# Altium footprint library xialeste-20221209.PcbLib: 113 footprints (part 4 of 8)
Each footprint in its own frame and in the unit in brackets; x right, y up, seen from the top. Pads: shape width x height; smd on the part's side, far side on the other; paste and mask are expansions set on the pad; w line width, h text height; cw(c..) or ccw(c..) is an arc to the next point about the centre after c.
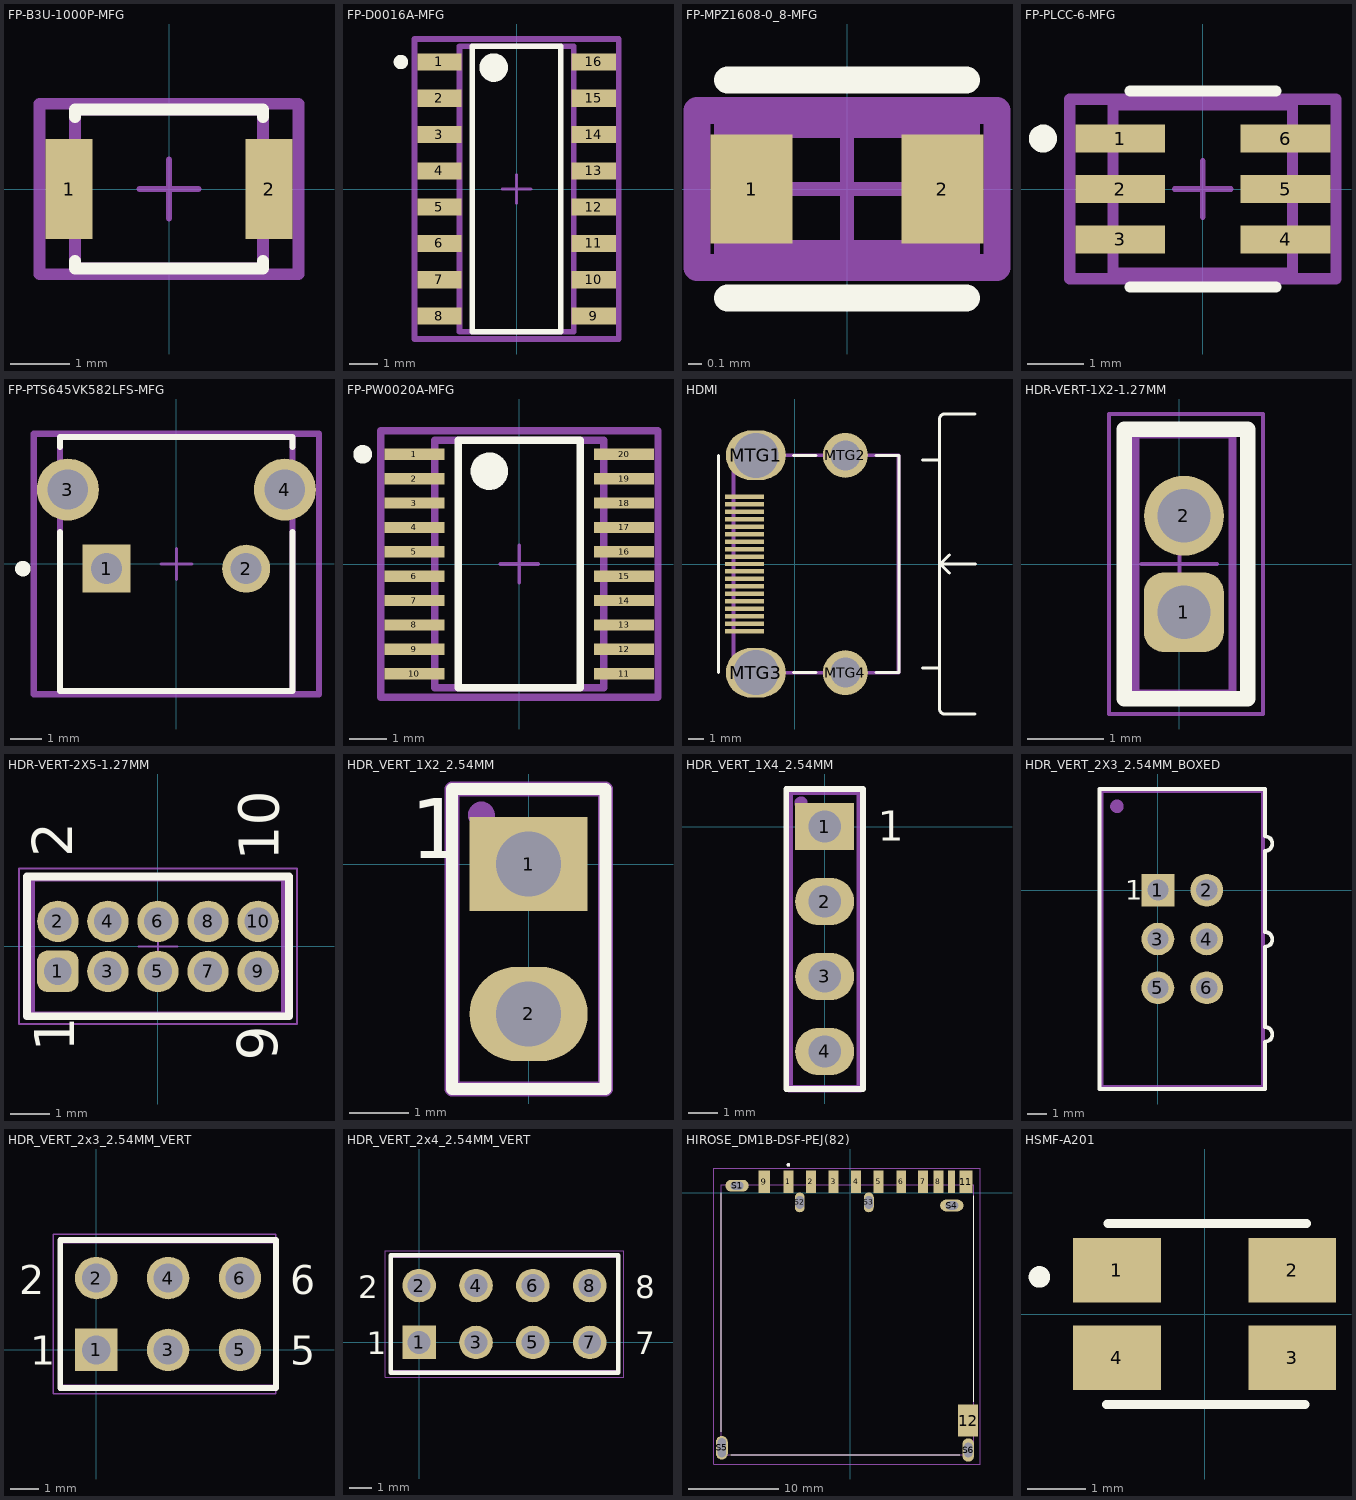
[diagram p3: the footprints below, top view; thin cyan lines are the x and y axes]

## FP-B3U-1000P-MFG [mm]
pads (2):
  rect 0.8x1.7 smd paste+0 mask+0: 1(-1.7,0) 2(1.7,0)
Top Overlay:
  lines w0.2: -1.6,-1.225 -1.6,-1.35 1.6,-1.35 1.6,-1.225 ; -1.6,1.225 -1.6,1.35 1.6,1.35 1.6,1.225
Top 3D Body:
  lines w0.2: -1.6,-1.35 1.6,-1.35 1.6,1.35 -1.6,1.35 -1.6,-1.35
Top Courtyard:
  lines w0.2: -2.2,-1.45 2.2,-1.45 2.2,1.45 -2.2,1.45 -2.2,-1.45
Top Assembly:
  lines w0.2: -2.2,-1.45 2.2,-1.45 2.2,1.45 -2.2,1.45 -2.2,-1.45
  text ".Designator" at 0,0.187 h1
Top Component Center:
  lines w0.1: -0.5,0 0.5,0 ; 0,-0.5 0,0.5
3D body "B3U-1000P--3DModel-STEP-56544.STEP": height 1.75, standoff 0, extent -2,-1.25 2,1.25

## FP-D0016A-MFG [mm]
pads (16):
  rect 1.55x0.6 smd paste-1000 mask+0: 1(-2.7,4.445) 2(-2.7,3.175) 3(-2.7,1.905) 4(-2.7,0.635) 5(-2.7,-0.635) 6(-2.7,-1.905) 7(-2.7,-3.175) 8(-2.7,-4.445) 9(2.7,-4.445) 10(2.7,-3.175) 11(2.7,-1.905) 12(2.7,-0.635) 13(2.7,0.635) 14(2.7,1.905) 15(2.7,3.175) 16(2.7,4.445)
Top Overlay:
  circle w0.25: c-4.05,4.445 r0.125
  circle w0.5: c-0.8,4.25 r0.25
  lines w0.2: -1.55,-5 1.55,-5 ; -1.55,-5 1.55,-5 ; -1.55,-5 -1.55,5 1.55,5 1.55,-5
Top Paste:
  rectangle: 1.95,-4.72 3.45,-4.17
  rectangle: 1.95,-3.45 3.45,-2.9
  rectangle: 1.95,-2.18 3.45,-1.63
  rectangle: 1.95,-0.91 3.45,-0.36
  rectangle: 1.95,0.36 3.45,0.91
  rectangle: 1.95,1.63 3.45,2.18
  rectangle: 1.95,2.9 3.45,3.45
  rectangle: 1.95,4.17 3.45,4.72
  rectangle: -3.45,-4.72 -1.95,-4.17
  rectangle: -3.45,-3.45 -1.95,-2.9
  rectangle: -3.45,-2.18 -1.95,-1.63
  rectangle: -3.45,-0.91 -1.95,-0.36
  rectangle: -3.45,0.36 -1.95,0.91
  rectangle: -3.45,1.63 -1.95,2.18
  rectangle: -3.45,2.9 -1.95,3.45
  rectangle: -3.45,4.17 -1.95,4.72
Top 3D Body:
  lines w0.2: -2,-5 2,-5 2,5 -2,5 -2,-5
Top Courtyard:
  lines w0.2: -3.575,-5.25 3.575,-5.25 3.575,5.25 -3.575,5.25 -3.575,-5.25
Top Assembly:
  lines w0.2: -3.575,-5.25 3.575,-5.25 3.575,5.25 -3.575,5.25 -3.575,-5.25
  text ".Designator" at 0,0.187 h1
Top Component Center:
  lines w0.1: -0.5,0 0.5,0 ; 0,-0.5 0,0.5
3D body "IC_Texas_Instruments_ULN2003LVDR_eec.STEP": height 0.25, standoff 0, extent -3.575,-5.25 3.575,5.25

## FP-MPZ1608-0_8-MFG [mm]
pads (2):
  rect 0.6x0.8 smd paste+0 mask+0: 1(-0.7,0) 2(0.7,0)
Top Overlay:
  lines w0.2: -0.875,-0.8 0.875,-0.8 ; -0.875,0.8 0.875,0.8
Top 3D Body:
  lines w0.2: -0.875,-0.475 0.875,-0.475 0.875,0.475 -0.875,0.475 -0.875,-0.475
Top Courtyard:
  lines w0.2: -1.1,-0.575 1.1,-0.575 1.1,0.575 -1.1,0.575 -1.1,-0.575
Top Assembly:
  lines w0.2: -1.1,-0.575 1.1,-0.575 1.1,0.575 -1.1,0.575 -1.1,-0.575
  text ".Designator" at 0,0.187 h1
Top Component Center:
  lines w0.1: -0.5,0 0.5,0 ; 0,-0.5 0,0.5
3D body "FBead_TDK_MPZ1608S221ATA00_eec.STEP": height 0.25, standoff 0, extent -1.1,-0.575 1.1,0.575

## FP-PLCC-6-MFG [mm]
pads (6):
  rect 1.6x0.5 smd paste+0 mask+0: 1(-1.475,0.9) 2(-1.475,0) 3(-1.475,-0.9) 4(1.475,-0.9) 5(1.475,0) 6(1.475,0.9)
Top Overlay:
  circle w0.25: c-2.85,0.9 r0.125
  lines w0.2: -1.3,-1.75 1.3,-1.75 ; -1.3,1.75 1.3,1.75
Top 3D Body:
  lines w0.2: -1.6,-1.5 -1.6,1.5 1.6,1.5 1.6,-1.5 -1.6,-1.5
Top Courtyard:
  lines w0.2: -2.375,-1.6 -2.375,1.6 2.375,1.6 2.375,-1.6 -2.375,-1.6
Top Assembly:
  lines w0.2: -2.375,-1.6 -2.375,1.6 2.375,1.6 2.375,-1.6 -2.375,-1.6
  text ".Designator" at 0,0.187 h1
Top Component Center:
  lines w0.1: -0.5,0 0.5,0 ; 0,-0.5 0,0.5
3D body "Diode_Broadcom_ASMT-YTD7-0AA02_eec.STEP": height 0.25, standoff 0, extent -2.375,-1.6 2.375,1.6

## FP-PTS645VK582LFS-MFG [mm]
pads (4):
  rect 1.55x1.55 hole 1 paste-1000 mask+0: 1(-2.25,-0.15)
  round 1.55 hole 1 paste-1000 mask+0: 2(2.25,-0.15)
  round 2 hole 1.3 paste-1000 mask+0: 3(-3.5,2.4) 4(3.5,2.4)
Top Overlay:
  circle w0.25: c-4.95,-0.15 r0.125
  lines w0.2: -3.75,1.025 -3.75,-4.1 3.75,-4.1 3.75,1.025 ; -3.75,3.775 -3.75,4.1 3.75,4.1 3.75,3.775
Top 3D Body:
  lines w0.2: -3.75,-4.1 3.75,-4.1 3.75,4.1 -3.75,4.1 -3.75,-4.1
Top Courtyard:
  lines w0.2: -4.6,-4.2 4.6,-4.2 4.6,4.2 -4.6,4.2 -4.6,-4.2
Top Assembly:
  lines w0.2: -4.6,-4.2 4.6,-4.2 4.6,4.2 -4.6,4.2 -4.6,-4.2
  text ".Designator" at 0,0.187 h1
Top Component Center:
  lines w0.1: -0.5,0 0.5,0 ; 0,-0.5 0,0.5
3D body "Switch_C&K_PTS645VK582LFS_eec.STEP": height 0.25, standoff 0, extent -4.6,-4.2 4.6,4.2

## FP-PW0020A-MFG [mm]
pads (20):
  rect 1.6x0.3 smd paste-1000 mask+0: 1(-2.8,2.925) 2(-2.8,2.275) 3(-2.8,1.625) 4(-2.8,0.975) 5(-2.8,0.325) 6(-2.8,-0.325) 7(-2.8,-0.975) 8(-2.8,-1.625) 9(-2.8,-2.275) 10(-2.8,-2.925) 11(2.8,-2.925) 12(2.8,-2.275) 13(2.8,-1.625) 14(2.8,-0.975) 15(2.8,-0.325) 16(2.8,0.325) 17(2.8,0.975) 18(2.8,1.625) 19(2.8,2.275) 20(2.8,2.925)
Top Overlay:
  circle w0.25: c-4.175,2.925 r0.125
  circle w0.5: c-0.8,2.475 r0.25
  lines w0.2: -1.625,-3.3 1.625,-3.3 ; -1.625,-3.3 1.625,-3.3 ; -1.625,-3.3 -1.625,3.3 1.625,3.3 1.625,-3.3
Top Paste:
  rectangle: -3.575,-3.05 -2.025,-2.8
  rectangle: -3.575,-2.4 -2.025,-2.15
  rectangle: -3.575,-1.75 -2.025,-1.5
  rectangle: -3.575,-1.1 -2.025,-0.85
  rectangle: -3.575,-0.45 -2.025,-0.2
  rectangle: -3.575,0.2 -2.025,0.45
  rectangle: -3.575,0.85 -2.025,1.1
  rectangle: -3.575,1.5 -2.025,1.75
  rectangle: -3.575,2.15 -2.025,2.4
  rectangle: -3.575,2.8 -2.025,3.05
  rectangle: 2.025,-3.05 3.575,-2.8
  rectangle: 2.025,-2.4 3.575,-2.15
  rectangle: 2.025,-1.75 3.575,-1.5
  rectangle: 2.025,-1.1 3.575,-0.85
  rectangle: 2.025,-0.45 3.575,-0.2
  rectangle: 2.025,0.2 3.575,0.45
  rectangle: 2.025,0.85 3.575,1.1
  rectangle: 2.025,1.5 3.575,1.75
  rectangle: 2.025,2.15 3.575,2.4
  rectangle: 2.025,2.8 3.575,3.05
Top 3D Body:
  lines w0.2: -2.25,-3.3 2.25,-3.3 2.25,3.3 -2.25,3.3 -2.25,-3.3
Top Courtyard:
  lines w0.2: -3.7,-3.55 3.7,-3.55 3.7,3.55 -3.7,3.55 -3.7,-3.55
Top Assembly:
  lines w0.2: -3.7,-3.55 3.7,-3.55 3.7,3.55 -3.7,3.55 -3.7,-3.55
  text ".Designator" at 0,-0.001 h1
Top Component Center:
  lines w0.1: -0.5,0 0.5,0 ; 0,-0.5 0,0.5
3D body "IC_Texas_Instruments_CDCE906PW_eec.STEP": height 0.25, standoff 0, extent -3.7,-3.55 3.7,3.55

## HDMI [mm]
pads (23):
  rect 2.6x0.3 smd mask+0.025: 1(-3.36,4.5) 2(-3.36,4) 3(-3.36,3.5) 4(-3.36,3) 5(-3.36,2.5) 6(-3.36,2) 7(-3.36,1.5) 8(-3.36,1) 9(-3.36,0.5) 10(-3.36,0) 11(-3.36,-0.5) 12(-3.36,-1) 13(-3.36,-1.5) 14(-3.36,-2) 15(-3.36,-2.5) 16(-3.36,-3) 17(-3.36,-3.5) 18(-3.36,-4) 19(-3.36,-4.5)
  oval 4x3.3 hole 3: MTG1(-2.6,7.25) MTG3(-2.6,-7.25)
  round 3 hole 2: MTG2(3.36,7.25) MTG4(3.36,-7.25)
Top Overlay:
  lines w0.2: -5.1,-7.25 -5.1,7.25 ; -0.1,-7.25 1.4,-7.25 ; -0.1,7.25 1.4,7.25 ; 5.4,-7.25 6.9,-7.25 6.95,-7.2 6.95,7.25 ; 5.4,7.25 6.9,7.25 ; 8.5,-6.95 9.65,-6.95 ; 8.5,6.95 9.65,6.95 ; 9.95,10 12,10 ; 10,10 ccw(c9.975,9.675) 9.65,9.7 9.65,-9.7 ccw(c9.975,-9.675) 10,-10 12,-10 ; 10.3,-0.6 9.7,0 ; 10.3,0.6 9.7,0 ; 12.05,0 9.7,0
Mechanical 1:
  text "plastic may go over the board edge" at -6.6,9.6 h0.5
  text "doesnt fit on one place. Bottom" at -6.5,10.8 h0.5
  text "NOTE: Holes are big and connector" at -6.5,12 h0.5
Mechanical 29:
  lines w0.254: -4.1,-7.25 6.9,-7.25 6.9,7.25 -4.1,7.25 -4.1,-7.25
  text ".Designator" at 0.5,2.3 h1
3D body "HDMI connector.STEP": height 6.23, standoff -2.15, extent -4.53,-7.5 7.62,7.5

## HDR-VERT-1X2-1.27MM [mm] "Pin Header, pitch 1.27 mm, THT, Vertical, dual row, 2p"
height 5.65
pads (2):
  rrect50% 1.05x1.05 hole 0.7: 1(0.06,-0.635)
  round 1.05 hole 0.7: 2(0.06,0.635)
Top Overlay:
  lines w0.2: -0.725,-1.775 -0.725,1.775 0.9,1.775 0.9,-1.775 -0.725,-1.775
Mechanical 13:
  lines w0.1: -0.575,-1.7 -0.575,1.7 0.7,1.7 0.7,-1.7 -0.575,-1.7
Mechanical 15:
  lines w0.05: -0.5,0 0.5,0 ; 0,-0.5 0,0.5 ; -0.925,-1.975 -0.925,1.975 1.1,1.975 1.1,-1.975 -0.925,-1.975
3D body "Pin header 2x01 TH pitch 1.27mm.stp": height 6.09, standoff -1.51, extent -0.535,-1.7 0.735,1.7

## HDR-VERT-2X5-1.27MM [mm] "Pin Header, pitch 1.27 mm, THT, Vertical, dual row, 10p"
height 5.65
pads (10):
  rrect50% 1.05x1.05 hole 0.7: 1(-2.54,-0.635)
  round 1.05 hole 0.7: 2(-2.54,0.635) 3(-1.27,-0.635) 4(-1.27,0.635) 5(0,-0.635) 6(0,0.635) 7(1.27,-0.635) 8(1.27,0.635) 9(2.54,-0.635) 10(2.54,0.635)
Top Overlay:
  lines w0.2: -3.325,-1.775 3.325,-1.775 3.325,1.775 -3.325,1.775 -3.325,-1.775
  text "2" at -2.172,2.264 h1.02
  text "1" at -2.127,-2.679 h1.02
  text "10" at 3.068,2.172 h1.02
  text "9" at 3.022,-2.908 h1.02
Mechanical 13:
  lines w0.1: -3.175,-1.7 3.175,-1.7 3.175,1.7 -3.175,1.7 -3.175,-1.7
Mechanical 15:
  lines w0.05: -0.5,0 0.5,0 ; 0,-0.5 0,0.5 ; -3.525,-1.975 3.525,-1.975 3.525,1.975 -3.525,1.975 -3.525,-1.975
3D body "62201021121.stp": height 5.33, standoff -2.27, extent -3.175,-1.7 3.175,1.7

## HDR_VERT_1X2_2.54MM [mm]
pads (2):
  rect 2x1.6 hole 1.1: 1(0,0)
  oval 2x1.6 hole 1.1: 2(0,-2.54)
Top Overlay:
  lines w0.2: -1.3,-3.81 1.3,-3.81 1.3,1.27 -1.3,1.27 -1.3,-3.81
  text "1" at -2,0.1 h1.02
Mechanical 29:
  circle w0.254: c-0.8,0.83 r0.1
  lines w0.254: -1.3,-3.81 -1.3,1.27 1.3,1.27 1.3,-3.81 -1.3,-3.81
  text ".Designator" at 0.6,-2.7 h1
3D body "1x2 Male Pin Header.STEP": height 10.54, standoff -3, extent -1.194,-3.813 1.306,1.272

## HDR_VERT_1X4_2.54MM [mm] "Creator MM"
pads (4):
  rect 2x1.6 hole 1.1: 1(0,0)
  oval 2x1.6 hole 1.1: 2(0,-2.54) 3(0,-5.08) 4(0,-7.62)
Top Overlay:
  lines w0.2: -1.3,-8.89 1.3,-8.89 1.3,1.27 -1.3,1.27 -1.3,-8.89
  text "1" at 1.8,-0.48 h1.02
Mechanical 29:
  circle w0.254: c-0.8,0.79 r0.1
  lines w0.254: -1.2,-8.89 -1.2,1.19 1.2,1.19 1.2,-8.89 -1.2,-8.89
  text ".Designator" at -0.7,-0.68 h1
3D body "1x4 Male Pin Header.STEP": height 10.54, standoff -3, extent -1.219,-8.918 1.281,1.247

## HDR_VERT_2X3_2.54MM_BOXED [mm] "Creator MM"
height 9.3
pads (6):
  rect 1.7x1.7 hole 1.1: 1(0,0)
  round 1.7 hole 1.1: 2(2.54,0) 3(0,-2.54) 4(2.54,-2.54) 5(0,-5.08) 6(2.54,-5.08)
Top Overlay:
  lines w0.2: 5.57,-10.34 -3.03,-10.34 -3.03,5.26 5.57,5.26 5.57,2.8 cw(c5.57,2.42) 5.57,2.04 5.57,-2.18 cw(c5.57,-2.56) 5.57,-2.94 5.57,-7.12 cw(c5.57,-7.5) 5.57,-7.88 5.57,-10.3
  text "1" at -1.7,-0.5 h1.02
Mechanical 29:
  circle w0.5: c-2.13,4.36 r0.1
  lines w0.2: -2.93,-10.24 -2.93,5.16 5.47,5.16 5.47,-10.24 -2.93,-10.24
  text ".Designator" at 2,-4.5 h1.52
3D body "DS1013-6S (IDC-6MS CONNFLY).stp": height 9, standoff -3.6, extent -3.13,-10.25 5.67,5.17

## HDR_VERT_2x3_2.54MM_VERT [mm] "Socket Header, Pitch 2.54 mm, THT, Vertical, dual row, 6p"
height 8.4
pads (6):
  rect 1.5x1.5 hole 1.02: 1(0,0)
  round 1.5 hole 1.02: 2(0,2.54) 3(2.54,0) 4(2.54,2.54) 5(5.08,0) 6(5.08,2.54)
Top Overlay:
  lines w0.2: -1.27,-1.345 6.35,-1.345 6.35,3.885 -1.27,3.885 -1.27,-1.345
  text "5" at 6.856,-0.53 h1.02
  text "6" at 6.856,1.97 h1.02
  text "2" at -2.73,1.97 h1.02
  text "1" at -2.33,-0.53 h1.02
Mechanical 13:
  lines w0.1: -1.27,-1.27 6.35,-1.27 6.35,3.81 -1.27,3.81 -1.27,-1.27
Mechanical 15:
  lines w0.05: -1.524,-1.545 6.35,-1.545 6.35,4.085 -1.524,4.085 -1.524,-1.545
3D body "Pin Header 2x3 TH Pitch 2.54mm.stp": height 2.8, standoff -9.9, extent -1.27,-1.27 6.35,3.81

## HDR_VERT_2x4_2.54MM_VERT [mm] "Socket Header, Pitch 2.54 mm, THT, Vertical, dual row, 8p"
height 8.4
pads (8):
  rect 1.5x1.5 hole 1.02: 1(0,0)
  round 1.5 hole 1.02: 2(0,2.54) 3(2.54,0) 4(2.54,2.54) 5(5.08,0) 6(5.08,2.54) 7(7.62,0) 8(7.62,2.54)
Top Overlay:
  lines w0.2: -1.27,-1.345 8.89,-1.345 8.89,3.885 -1.27,3.885 -1.27,-1.345
  text "7" at 9.65,-0.53 h1.02
  text "8" at 9.65,1.97 h1.02
  text "2" at -2.73,1.97 h1.02
  text "1" at -2.33,-0.53 h1.02
Mechanical 13:
  lines w0.1: -1.27,-1.27 8.89,-1.27 8.89,3.81 -1.27,3.81 -1.27,-1.27
Mechanical 15:
  lines w0.05: -1.524,-1.545 9.144,-1.545 9.144,4.085 -1.524,4.085 -1.524,-1.545
3D body "Pin Header 2x4 TH Pitch 2.54mm.stp": height 2.8, standoff -9.9, extent -1.27,-1.27 8.89,3.81

## HIROSE_DM1B-DSF-PEJ(82) [mm]
pads (18):
  rect 1.1x2.5 smd: 1(-6.875,1.25) 2(-4.375,1.25) 3(-1.875,1.25) 4(0.625,1.25) 5(3.125,1.25) 6(5.625,1.25) 7(8.05,1.25) 8(9.75,1.25)
  rect 1.25x2.5 smd: 9(-9.57,1.25)
  rect 0.8x2.5 smd: 10(11.2,1.25)
  rect 1.4x2.5 smd: 11(12.8,1.25)
  rect 2.2x3.5 smd: 12(13.03,-25.23)
  oval 2.6x1.3 hole 0.9 slot 1.4 at 0 deg: S1(-12.57,0.8) S4(11.23,-1.4)
  oval 1.1x2.2 hole 0.9 slot 1.4 at 90 deg: S2(-5.62,-1.05) S3(2.03,-1.05)
  oval 1.3x2.6 hole 0.9 slot 2.1 at 90 deg: S5(-14.25,-28.25)
  oval 1.3x2.6 hole 0.9 slot 1.6 at 90 deg: S6(13.06,-28.5)
Top Overlay:
  circle w0.2: c-6.875,3.1 r0.1
  lines w0.127: -14.35,-26.5 -14.35,0 ; -13.28,-29 12.09,-29 ; 13.65,-23.16 13.65,-0.32
Mechanical 13:
  circle w0.2: c-6.875,3.1 r0.1
  lines w0.127: -14.35,-29 -14.35,0.9 13.65,0.9 13.65,-29 -14.35,-29
Mechanical 15:
  lines w0.05: -15.15,-30.05 14.38,-30.05 14.38,2.75 -15.15,2.75 -15.15,-30.05
3D body "DM1B-DSF-PEJ.stp": height 2.9, standoff -0.65, extent -14.377,-29.622 13.673,0.828

## HSMF-A201 [mm] "LED"
height 1.2
pads (4):
  rect 1.5x1.1 smd: 1(-1.5,0.75) 2(1.5,0.75) 3(1.5,-0.75) 4(-1.5,-0.75)
Top Overlay:
  circle w0.25: c-2.827,0.635 r0.059
  lines w0.152: -1.676,-1.549 1.724,-1.549 ; -1.651,1.549 1.749,1.549
3D body "HSMF-A201-A00J1.step": height 1.9, standoff 0, extent -1.74,-1.5 1.74,1.5